# Altium footprint library LimeMicroAltiumLib_pcbLib_r01.PcbLib: 434 footprints (part 6 of 29)
Each footprint in its own frame and in the unit in brackets; x right, y up, seen from the top. Pads: shape width x height; smd on the part's side, far side on the other; paste and mask are expansions set on the pad; w line width, h text height; cw(c..) or ccw(c..) is an arc to the next point about the centre after c.
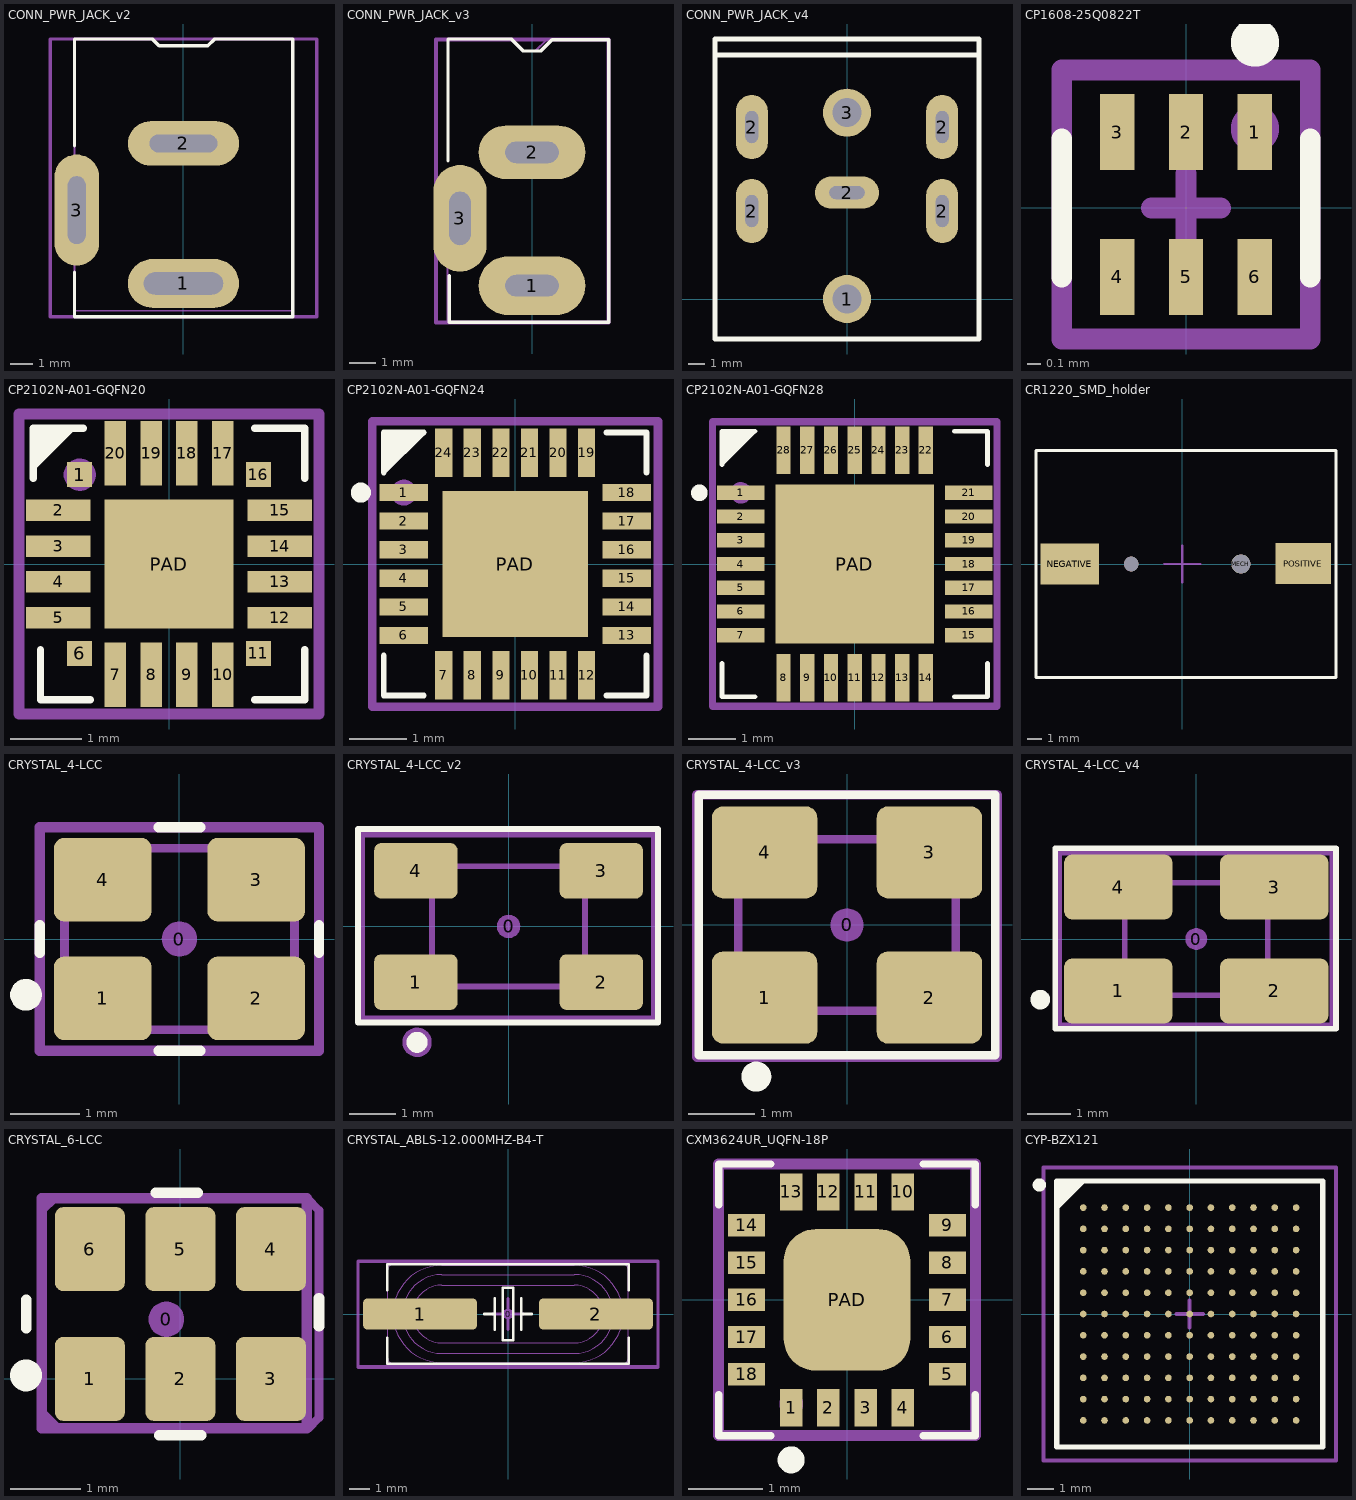
[diagram p5: the footprints below, top view; thin cyan lines are the x and y axes]

## CONN_PWR_JACK_v2 [mm] "Power Connector, 2.1mm ID, 5.5mm OD"
height 11
pads (3):
  oval 5x2.2 hole 1 slot 3.56 at 0 deg: 1(0,-14)
  oval 5x2 hole 0.8 slot 3.05 at 0 deg: 2(0,-7.7)
  oval 2x5 hole 0.8 slot 3.05 at 90 deg: 3(-4.8,-10.7)
Top Overlay:
  lines w0.15: -4.9,-13.5 -4.9,-15.5 4.925,-15.5 4.925,-3 1.4,-3 1.1,-3.3 -1.1,-3.3 -1.4,-3 -4.9,-3 -4.9,-7.8
Mechanical 13:
  lines w0.076: -4.9,-12.4 -4.9,-15.225 4.925,-15.225 4.925,-3 1.4,-3 1.1,-3.3 -1.1,-3.3 -1.4,-3 -4.9,-3 -4.9,-9
Mechanical 15:
  lines w0.15: -6,-15.5 6,-15.5 6,-3 -6,-3 -6,-15.5
  text ".Designator" at -0.1,-9 h0.55
3D body "3100-522 Connector.stp": height 11, standoff -3.5, extent -4.9,-14.1 4.5,0

## CONN_PWR_JACK_v3 [mm]
height 7.4
pads (3):
  oval 4x2.2 hole 0.8 slot 2 at 0 deg: 1(0,-13.675)
  oval 4x2 hole 0.8 slot 2 at 0 deg: 2(0,-8.675)
  oval 2x4 hole 0.8 slot 2 at 90 deg: 3(-2.7,-11.15)
Top Overlay:
  lines w0.127: -3.15,-9 -3.15,-4.425 -0.775,-4.425 -0.325,-4.875 0.325,-4.875 0.75,-4.45 2.875,-4.45 2.875,-15.05 -3.1,-15.05 -3.1,-13.3
Mechanical 13:
  lines w0.076: -3.175,-12.4 -3.175,-15.05 2.9,-15.05 2.9,-4.45 0.55,-4.45 0.125,-4.875 -0.325,-4.875 -0.775,-4.425 -3.15,-4.425 -3.15,-9
Mechanical 15:
  lines w0.15: -3.6,-15.05 2.875,-15.05 2.875,-4.45 -3.6,-4.45 -3.6,-15.05
  text ".Designator" at -0.1,-9 h0.55
3D body "pj-031dh.stp": height 7.4, standoff -3.2, extent -2.85,-14.025 2.55,-2.425

## CONN_PWR_JACK_v4 [mm]
pads (7):
  round 3 hole 1.8: 1(0,0) 3(0,11.65)
  oval 2x4 hole 0.8 slot 2 at 90 deg: 2(-5.95,5.5) 2(-5.95,10.75) 2(5.95,5.5) 2(5.95,10.75)
  oval 4x2 hole 0.8 slot 2.2 at 0 deg: 2(0,6.65)
Top Overlay:
  lines w0.3: -8.25,15.25 8.25,15.25 ; -8.25,-2.5 8.25,-2.5 8.25,16.25 -8.25,16.25 -8.25,-2.5
Mechanical 15:
  lines w0.15: -8.25,-2.5 8.25,-2.5 8.25,16.25 -8.25,16.25 -8.25,-2.5
  text ".designator" at 0,6.6 h0.55

## CP1608-25Q0822T [mm]
pads (6):
  rect 0.25x0.55 smd mask+0.05: 1(0.5,0.55) 2(0,0.55) 3(-0.5,0.55) 4(-0.5,-0.5) 5(0,-0.5) 6(0.5,-0.5)
Top Overlay:
  circle w0.3: c0.5,1.2 r0.025
  lines w0.15: -0.9,-0.5 -0.9,0.5 ; 0.9,-0.5 0.9,0.5
Mechanical 15:
  circle w0.3: c0.5,0.575 r0.025
  lines w0.15: -0.25,0 0.25,0 ; 0,-0.25 0,0.25 ; -0.9,-0.95 -0.9,1 0.9,1 0.9,-0.95 -0.9,-0.95
  text ".Designator" at 0,0 h0.55
3D body: height 0.6, standoff 0, extent -0.8,-0.4 0.8,0.4
3D body: height 0.6, standoff 0, extent 0.463,-0.075 0.663,0.15
3D body: height 0.6, standoff 0, extent -0.65,-0.425 -0.35,-0.275
3D body: height 0.6, standoff 0, extent -0.15,-0.425 0.15,-0.275
3D body: height 0.6, standoff 0, extent 0.35,-0.425 0.65,-0.275
3D body: height 0.6, standoff 0, extent 0.35,0.275 0.65,0.425
3D body: height 0.6, standoff 0, extent -0.15,0.275 0.15,0.425
3D body: height 0.6, standoff 0, extent -0.65,0.275 -0.35,0.425

## CP2102N-A01-GQFN20 [mm]
pads (21):
  rect 0.35x0.35 smd mask+0.05: 1(-1.25,1.25) 6(-1.25,-1.25) 11(1.25,-1.25) 16(1.25,1.25)
  rect 0.9x0.3 smd mask+0.05: 2(-1.55,0.75) 3(-1.55,0.25) 4(-1.55,-0.25) 5(-1.55,-0.75) 12(1.55,-0.75) 13(1.55,-0.25) 14(1.55,0.25) 15(1.55,0.75)
  rect 0.3x0.9 smd mask+0.05: 7(-0.75,-1.55) 8(-0.25,-1.55) 9(0.25,-1.55) 10(0.75,-1.55) 17(0.75,1.55) 18(0.25,1.55) 19(-0.25,1.55) 20(-0.75,1.55)
  rect 1.8x1.8 smd mask+0.05: PAD(0,0)
Top Overlay:
  region: -1.9,1.3 -1.3,1.9 -1.9,1.9
  lines w0.1: -1.9,1.2 -1.9,1.9 -1.2,1.9 ; -1.8,-1.2 -1.8,-1.9 -1.1,-1.9 ; 1.2,-1.9 1.9,-1.9 1.9,-1.2 ; 1.2,1.9 1.9,1.9 1.9,1.2
Mechanical 15:
  circle w0.25: c-1.25,1.25 r0.1
  lines w0.15: -0.5,0 0.5,0 ; 0,-0.5 0,0.5 ; -2.1,-2.1 2.1,-2.1 2.1,2.1 -2.1,2.1 -2.1,-2.1
  text ".Designator" at 0,0 h0.55
3D body "SW3dPS-QFN-20.STEP": height 0.62, standoff -0.08, extent -1.5,-1.5 1.5,1.5

## CP2102N-A01-GQFN24 [mm]
pads (25):
  rect 0.85x0.3 smd mask+0.05: 1(-1.95,1.25) 2(-1.95,0.75) 3(-1.95,0.25) 4(-1.95,-0.25) 5(-1.95,-0.75) 6(-1.95,-1.25) 13(1.95,-1.25) 14(1.95,-0.75) 15(1.95,-0.25) 16(1.95,0.25) 17(1.95,0.75) 18(1.95,1.25)
  rect 0.3x0.85 smd mask+0.05: 7(-1.25,-1.95) 8(-0.75,-1.95) 9(-0.25,-1.95) 10(0.25,-1.95) 11(0.75,-1.95) 12(1.25,-1.95) 19(1.25,1.95) 20(0.75,1.95) 21(0.25,1.95) 22(-0.25,1.95) 23(-0.75,1.95) 24(-1.25,1.95)
  rect 2.55x2.55 smd mask+0.05: PAD(0,0)
Top Overlay:
  circle w0.25: c-2.7,1.25 r0.05
  region: -2.3,1.55 -1.55,2.3 -2.3,2.3
  lines w0.1: -2.3,-1.6 -2.3,-2.3 -1.6,-2.3 ; -2.3,1.6 -2.3,2.3 -1.6,2.3 ; 1.6,-2.3 2.3,-2.3 2.3,-1.6 ; 1.6,2.3 2.3,2.3 2.3,1.6
Mechanical 15:
  circle w0.25: c-1.95,1.25 r0.1
  lines w0.15: -0.5,0 0.5,0 ; 0,-0.5 0,0.5 ; -2.5,-2.5 2.5,-2.5 2.5,2.5 -2.5,2.5 -2.5,-2.5
  text ".Designator" at 0,0 h0.55
3D body "User Library-QFN 24 4x4.step": height 0.9, standoff 0, extent -2.002,-2.002 2.002,2.002

## CP2102N-A01-GQFN28 [mm]
pads (29):
  rect 1x0.3 smd mask+0.05: 1(-2.4,1.5) 2(-2.4,1) 3(-2.4,0.5) 4(-2.4,0) 5(-2.4,-0.5) 6(-2.4,-1) 7(-2.4,-1.5) 15(2.4,-1.5) 16(2.4,-1) 17(2.4,-0.5) 18(2.4,0) 19(2.4,0.5) 20(2.4,1) 21(2.4,1.5)
  rect 0.3x1 smd mask+0.05: 8(-1.5,-2.4) 9(-1,-2.4) 10(-0.5,-2.4) 11(0,-2.4) 12(0.5,-2.4) 13(1,-2.4) 14(1.5,-2.4) 22(1.5,2.4) 23(1,2.4) 24(0.5,2.4) 25(0,2.4) 26(-0.5,2.4) 27(-1,2.4) 28(-1.5,2.4)
  rect 3.35x3.35 smd mask+0.05: PAD(0,0)
Top Overlay:
  circle w0.25: c-3.275,1.5 r0.05
  region: -2.8,2.05 -2.05,2.8 -2.8,2.8
  lines w0.1: -2.8,-2.1 -2.8,-2.8 -2.1,-2.8 ; -2.8,2.1 -2.8,2.8 -2.1,2.8 ; 2.1,-2.8 2.8,-2.8 2.8,-2.1 ; 2.1,2.8 2.8,2.8 2.8,2.1
Mechanical 15:
  circle w0.25: c-2.4,1.5 r0.1
  lines w0.15: -0.5,0 0.5,0 ; 0,-0.5 0,0.5 ; -3,-3 3,-3 3,3 -3,3 -3,-3
  text ".Designator" at 0,0 h0.55
3D body "User Library-QFN28-0_5.STEP": height 1, standoff 0, extent -2.5,-2.5 2.5,2.5

## CR1220_SMD_holder [mm]
pads (4):
  round 1 hole 1 unplated mask+0.05: MECH(-3.5,0)
  round 1.3 hole 1.3 unplated mask+0.05: MECH(4,0)
  rect 4x2.8 smd mask+0.05: NEGATIVE(-7.7,0)
  rect 3.8x2.8 smd mask+0.05: POSITIVE(8.275,0.025)
Top Overlay:
  lines w0.2: -10,-7.75 10.5,-7.75 10.5,7.75 -10,7.75 -10,-7.75
Mechanical 15:
  lines w0.15: -1.25,0 1.25,0 ; 0,-1.25 0,1.25 ; -10,-7.75 10.5,-7.75 10.5,7.75 -10,7.75 -10,-7.75
  text ".Designator" at 0,0 h0.55
  text "NEGATIVE / TERMINAL" at -9.5,-1 h0.55
  text "POSITIVE / TERMINAL" at 6,-1 h0.55
3D body "User Library-cr1220.STEP": height 3.94, standoff -1, extent -8.75,-7.497 9.75,7.5

## CRYSTAL_4-LCC [mm] "SMD Crystal 4-lead leadless package"
height 0.8
pads (5):
  round 0.508 on Mech15: 0(0,0)
  rrect25% 1.4x1.2 smd: 1(-1.1,-0.85) 2(1.1,-0.85) 3(1.1,0.85) 4(-1.1,0.85)
Top Overlay:
  circle w0.254: c-2.2,-0.8 r0.1
  lines w0.15: -2,-0.2 -2,0.2 ; -0.3,-1.6 0.3,-1.6 ; -0.3,1.6 0.3,1.6 ; 2,-0.2 2,0.2
Mechanical 13:
  lines w0.127: -1.65,-1.143 -1.65,1.143 -1.493,1.3 1.494,1.3 1.65,1.144 1.65,-1.143 1.493,-1.3 -1.493,-1.3 -1.65,-1.143
Mechanical 15:
  circle w0.35: c-1.4,-1.1 r0.141
  lines w0.15: -2,-1.6 -2,1.6 2,1.6 2,-1.6 -2,-1.6
  text ".Designator" at 0,0 h0.55
3D body "Crystal TXC Corp 7M series.STEP": height 0.8, standoff 0, extent -1.65,-1.3 1.65,1.3

## CRYSTAL_4-LCC_v2 [mm] "SMD Crystal 4-lead leadless package"
height 0.8
pads (5):
  round 0.508 on Mech15: 0(0,0)
  rrect25% 1.8x1.2 smd: 1(-2,-1.2) 2(2,-1.2) 3(2,1.2) 4(-2,1.2)
Top Overlay:
  circle w0.254: c-1.975,-2.5 r0.1
  lines w0.127: -3.25,-2.075 3.225,-2.075 3.225,2.1 -3.25,2.1 -3.25,-2.075
Mechanical 13:
  lines w0.127: -1.65,-1.143 -1.65,1.143 -1.493,1.3 1.494,1.3 1.65,1.144 1.65,-1.143 1.493,-1.3 -1.493,-1.3 -1.65,-1.143
Mechanical 15:
  circle w0.35: c-1.975,-2.5 r0.141
  lines w0.15: -3.175,-2 -3.175,2 3.15,2 3.15,-2 -3.175,-2
  text ".Designator" at 0,0 h0.55
3D body "Crystal TXC Corp 7M series.STEP": height 0.8, standoff 0, extent -1.65,-1.3 1.65,1.3

## CRYSTAL_4-LCC_v3 [mm] "SMD Crystal 4-lead leadless package"
height 0.8
pads (5):
  round 0.508 on Mech15: 0(0,0)
  rrect25% 1.6x1.4 smd: 1(-1.25,-1.1) 2(1.25,-1.1) 3(1.25,1.1) 4(-1.25,1.1)
Top Overlay:
  circle w0.254: c-1.375,-2.3 r0.1
  lines w0.127: -2.25,-1.975 2.25,-1.975 2.25,1.975 -2.25,1.975 -2.25,-1.975
Mechanical 13:
  lines w0.127: -1.65,-1.143 -1.65,1.143 -1.493,1.3 1.494,1.3 1.65,1.144 1.65,-1.143 1.493,-1.3 -1.493,-1.3 -1.65,-1.143
Mechanical 15:
  circle w0.35: c-1.5,-1.3 r0.141
  lines w0.15: -2.275,-2 -2.275,1.975 2.275,1.975 2.275,-2 -2.275,-2
  text ".Designator" at 0,0 h0.55
3D body "Crystal TXC Corp 7M series.STEP": height 0.8, standoff 0, extent -1.65,-1.3 1.65,1.3

## CRYSTAL_4-LCC_v4 [mm] "SMD Crystal 4-lead leadless package"
height 0.8
pads (5):
  round 0.508 on Mech15: 0(0,0)
  rrect25% 2.5x1.5 smd: 1(-1.8,-1.2) 2(1.8,-1.2) 3(1.8,1.2) 4(-1.8,1.2)
Top Overlay:
  circle w0.254: c-3.6,-1.4 r0.1
  lines w0.127: -3.25,-2.075 -3.25,2.1 3.225,2.1 3.225,-2.075 -3.25,-2.075
Mechanical 13:
  lines w0.127: -1.65,-1.143 -1.493,-1.3 1.493,-1.3 1.65,-1.143 1.65,1.144 1.494,1.3 -1.493,1.3 -1.65,1.143 -1.65,-1.143
Mechanical 15:
  circle w0.35: c-2.2,-1.3 r0.141
  lines w0.15: -3.175,-2 3.15,-2 3.15,2 -3.175,2 -3.175,-2
  text ".Designator" at 0,0 h0.55
3D body "User Library-Crystal.step": height 0.9, standoff -0.05, extent -2.5,-1.6 2.5,1.6

## CRYSTAL_6-LCC [mm] "SMD Crystal 6-lead leadless package"
height 0.8
pads (7):
  round 0.508 on Mech15: 0(-0.2,0.85)
  rrect25% 1x1.2 smd: 1(-1.29,0) 2(0,0) 3(1.29,0) 4(1.29,1.85) 5(0,1.85) 6(-1.29,1.85)
Top Overlay:
  circle w0.254: c-2.2,0.05 r0.1
  lines w0.15: -2.2,0.725 -2.2,1.125 ; -0.35,2.65 0.25,2.65 ; -0.3,-0.8 0.3,-0.8 ; 1.975,0.75 1.975,1.15
Mechanical 13:
  lines w0.127: -1.975,-0.475 -1.975,2.4 -1.8,2.575 1.8,2.575 1.975,2.4 1.975,-0.55 1.825,-0.7 -1.75,-0.7 -1.975,-0.475
Mechanical 15:
  lines w0.15: -1.975,-0.7 -1.975,2.575 1.8,2.575 1.8,-0.7 -1.975,-0.7
  lines w0.35: -1.185,0.018 ccw(c-1.304,0.001) -1.184,0
  text ".Designator" at -0.2,0.85 h0.55
3D body "User Library-SG310.SLDPRT": height 1.05, standoff 0, extent -1.6,-0.3 1.6,2.2

## CRYSTAL_ABLS-12.000MHZ-B4-T [mm] "SMD Crystal ABLS-12.000MHZ-B4-T package"
height 4.3
pads (3):
  round 0.508 on Mech14: 0(0,0)
  rrect25% 5.5x1.5 smd: 1(-4.25,0) 2(4.25,0)
Top Overlay:
  lines w0.127: -5.842,-1.143 -5.842,-2.413 5.842,-2.413 5.842,-1.143 ; -5.842,1.143 -5.842,2.413 5.842,2.413 5.842,1.143 ; -1.143,0 -0.635,0 ; -0.635,-0.762 -0.635,0.762 ; 0.635,-0.762 0.635,0.762 ; 0.635,0 1.143,0 ; -0.254,-1.27 -0.254,1.27 0.254,1.27 0.254,-1.27 -0.254,-1.27
Mechanical 13:
  lines w0.05: -5.8,-0.45 -6.4,-0.45 -6.4,0.45 -5.8,0.45 ; 5.8,-0.45 6.4,-0.45 6.4,0.45 5.8,0.45 ; -5.8,-2.165 ccw(c-5.55,-2.165) -5.55,-2.415 5.55,-2.415 ccw(c5.55,-2.165) 5.8,-2.165 5.8,2.165 ccw(c5.55,2.165) 5.55,2.415 -5.55,2.415 ccw(c-5.55,2.165) -5.8,2.165 -5.8,-2.165 ; -3.2,-2.35 cw(c-3.2,0) -3.2,2.35 3.2,2.35 cw(c3.2,0) 3.2,-2.35 -3.2,-2.35 ; -3.2,-1.9 cw(c-3.2,0) -3.2,1.9 3.2,1.9 cw(c3.2,0) 3.2,-1.9 -3.2,-1.9 ; -3.2,-1.4 cw(c-3.2,0) -3.2,1.4 3.2,1.4 cw(c3.2,0) 3.2,-1.4 -3.2,-1.4
Mechanical 14:
  lines w0.127: -7.239,-2.54 -7.239,2.54 7.239,2.54 7.239,-2.54 -7.239,-2.54
Mechanical 15:
  lines w0.15: -0.75,0 0,0 ; 0,-0.75 0,0 ; 0,0.75 0,0 ; 0.75,0 0,0 ; -7.25,-2.575 7.25,-2.575 7.25,2.55 -7.25,2.55 -7.25,-2.575
  text ".Designator" at 0,0 h0.55
3D body "Crystal HC49_US-SM.STEP": height 4.29, standoff -0.01, extent -6.4,-2.415 6.4,2.415

## CXM3624UR_UQFN-18P [mm]
pads (19):
  rect 0.3x0.5 smd mask+0.05: 1(-0.75,-1.45) 2(-0.25,-1.45) 3(0.25,-1.45) 4(0.75,-1.45) 10(0.75,1.45) 11(0.25,1.45) 12(-0.25,1.45) 13(-0.75,1.45)
  rect 0.5x0.3 smd mask+0.05: 5(1.35,-1) 6(1.35,-0.5) 7(1.35,0) 8(1.35,0.5) 9(1.35,1) 14(-1.35,1) 15(-1.35,0.5) 16(-1.35,0) 17(-1.35,-0.5) 18(-1.35,-1)
  rrect50% 1.7x1.9 smd paste-0.1 mask+0.05: PAD(0,0)
Top Overlay:
  circle w0.25: c-0.75,-2.15 r0.056
  lines w0.1: -1.725,-1.275 -1.725,-1.825 -1.025,-1.825 ; -1.725,1.275 -1.725,1.825 -1.025,1.825 ; 1.025,-1.825 1.725,-1.825 1.725,-1.275 ; 1.025,1.825 1.725,1.825 1.725,1.275
Mechanical 15:
  circle w0.25: c-0.75,-1.4 r0.035
  lines w0.15: -0.5,0 0,0 ; 0,-0.5 0,0 ; 0,0.5 0,0 ; 0.5,0 0,0 ; -1.725,-1.825 1.725,-1.825 1.725,1.825 -1.725,1.825 -1.725,-1.825
  text ".Designator" at 0,0 h0.55
3D body: height 0.55, standoff 0, extent -1.4,-1.5 1.4,1.5
3D body: height 0.56, standoff 0, extent -1.198,-1.3 -0.8,-0.9

## CYP-BZX121 [mm] "BGA, 121-Balls, Body 10x10mm, Pitch 0.8mm"
height 1.2
pads (121):
  round 0.25 smd: A1(-4,4) A2(-3.2,4) A3(-2.4,4) A4(-1.6,4) A5(-0.8,4) A6(0,4) A7(0.8,4) A8(1.6,4) A9(2.4,4) A10(3.2,4) A11(4,4) B1(-4,3.2) B2(-3.2,3.2) B3(-2.4,3.2) B4(-1.6,3.2) B5(-0.8,3.2) B6(0,3.2) B7(0.8,3.2) B8(1.6,3.2) B9(2.4,3.2) B10(3.2,3.2) B11(4,3.2) C1(-4,2.4) C2(-3.2,2.4) C3(-2.4,2.4) C4(-1.6,2.4) C5(-0.8,2.4) C6(0,2.4) C7(0.8,2.4) C8(1.6,2.4) C9(2.4,2.4) C10(3.2,2.4) C11(4,2.4) D1(-4,1.6) D2(-3.2,1.6) D3(-2.4,1.6) D4(-1.6,1.6) D5(-0.8,1.6) D6(0,1.6) D7(0.8,1.6) D8(1.6,1.6) D9(2.4,1.6) D10(3.2,1.6) D11(4,1.6) E1(-4,0.8) E2(-3.2,0.8) E3(-2.4,0.8) E4(-1.6,0.8) E5(-0.8,0.8) E6(0,0.8) E7(0.8,0.8) E8(1.6,0.8) E9(2.4,0.8) E10(3.2,0.8) E11(4,0.8) F1(-4,0) F2(-3.2,0) F3(-2.4,0) F4(-1.6,0) F5(-0.8,0) F6(0,0) F7(0.8,0) F8(1.6,0) F9(2.4,0) F10(3.2,0) F11(4,0) G1(-4,-0.8) G2(-3.2,-0.8) G3(-2.4,-0.8) G4(-1.6,-0.8) G5(-0.8,-0.8) G6(0,-0.8) G7(0.8,-0.8) G8(1.6,-0.8) G9(2.4,-0.8) G10(3.2,-0.8) G11(4,-0.8) H1(-4,-1.6) H2(-3.2,-1.6) H3(-2.4,-1.6) H4(-1.6,-1.6) H5(-0.8,-1.6) H6(0,-1.6) H7(0.8,-1.6) H8(1.6,-1.6) H9(2.4,-1.6) H10(3.2,-1.6) H11(4,-1.6) J1(-4,-2.4) J2(-3.2,-2.4) J3(-2.4,-2.4) J4(-1.6,-2.4) J5(-0.8,-2.4) J6(0,-2.4) J7(0.8,-2.4) J8(1.6,-2.4) J9(2.4,-2.4) J10(3.2,-2.4) J11(4,-2.4) K1(-4,-3.2) K2(-3.2,-3.2) K3(-2.4,-3.2) K4(-1.6,-3.2) K5(-0.8,-3.2) K6(0,-3.2) K7(0.8,-3.2) K8(1.6,-3.2) K9(2.4,-3.2) K10(3.2,-3.2) K11(4,-3.2) L1(-4,-4) L2(-3.2,-4) L3(-2.4,-4) L4(-1.6,-4) L5(-0.8,-4) L6(0,-4) L7(0.8,-4) L8(1.6,-4) L9(2.4,-4) L10(3.2,-4) L11(4,-4)
Top Overlay:
  circle w0.25: c-5.65,4.85 r0.125
  region: -4,5 -5,4 -5,5
  lines w0.2: -5,4 -4,5 ; -5,-5 5,-5 5,5 -5,5 -5,-5
Mechanical 13:
  lines w0.1: -5,-5 5,-5 5,5 -5,5 -5,-5
Mechanical 15:
  lines w0.15: -0.5,0 0.5,0 ; 0,-0.5 0,0.5 ; -5.5,-5.5 5.5,-5.5 5.5,5.5 -5.5,5.5 -5.5,-5.5
  text ".Designator" at 0,0 h0.55
3D body: height 1.3, standoff 1.2, extent -4.4,3.6 -3.6,4.4
3D body: height 1.2, standoff 0.15, extent -5,-5 5,5